# Altium footprint library SOT SOD TO DAPK.PcbLib: 156 footprints (part 1 of 10)
Each footprint in its own frame and in the unit in brackets; x right, y up, seen from the top. Pads: shape width x height; smd on the part's side, far side on the other; paste and mask are expansions set on the pad; w line width, h text height; cw(c..) or ccw(c..) is an arc to the next point about the centre after c.
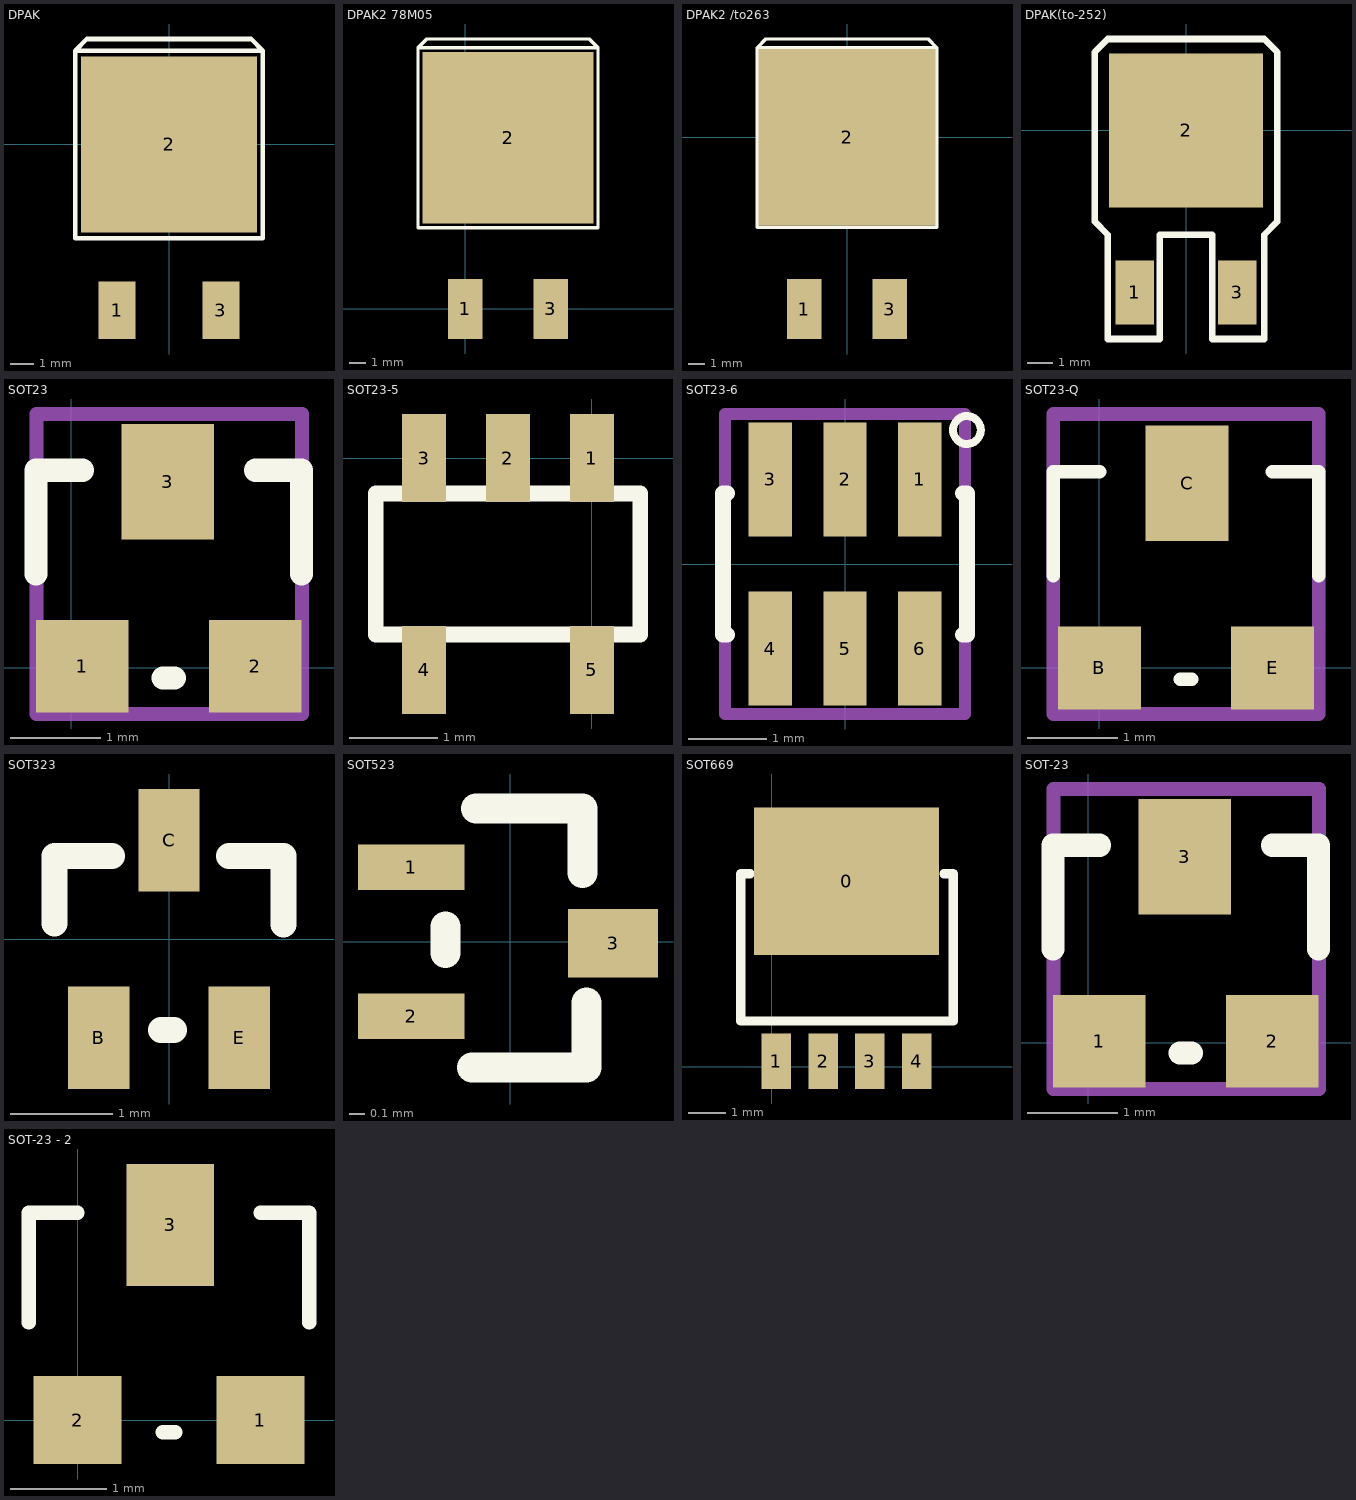
[diagram p0: the footprints below, top view; thin cyan lines are the x and y axes]

## DPAK [mm]
pads (3):
  rect 1.6x2.5 smd: 1(-2.25,-7.18) 3(2.25,-7.18)
  rect 7.62x7.62 smd: 2(0,0)
Top Overlay:
  lines w0.203: -4.064,4.064 4.064,4.064 ; -4.064,4.064 -4.064,-4.064 4.064,-4.064 4.064,4.064 ; -4.064,4.064 -3.556,4.572 3.556,4.572 4.064,4.064
3D body "User Library-DPAK_TO-252AA.step": height 2.37, standoff -0.03, extent -3.621,-7.241 3.113,2.859

## DPAK2 78M05 [mil]
pads (3):
  rect 80x140 smd: 1(0,0) 3(200,0)
  rect 400x400 smd: 2(100,400)
Top Overlay:
  lines w8: -110,610 310,610 ; -110,610 -110,190 310,190 310,610 ; -110,610 -90,630 290,630 310,610
3D body "SW3dPS-DPAK.STEP": height 192.32, standoff -5.24, extent -110,-30.72 290,570.22

## DPAK2 /to263 [mil]
pads (3):
  rect 80x140 smd: 1(-100,-401.57) 3(100,-401.57)
  rect 412.99x413.39 smd: 2(0,0)
Top Overlay:
  lines w8: -210,210 210,210 ; -210,210 -210,-210 210,-210 210,210 ; -210,210 -190,230 190,230 210,210
3D body "SW3dPS-DPAK.STEP": height 192.32, standoff -5.24, extent -205,-425 195,175.93

## DPAK(to-252) [mm]
pads (3):
  rect 1.5x2.5 smd: 1(-2,-6.312) 3(2,-6.312)
  rect 6x6 smd: 2(0,0)
Top Overlay:
  lines w0.254: -3.556,-3.556 -3.048,-4.064 -3.048,-8.128 -1.016,-8.128 -1.016,-4.064 1.016,-4.064 1.016,-8.128 3.048,-8.128 3.048,-4.064 3.556,-3.556 3.556,3.048 3.048,3.556 -3.048,3.556 -3.556,3.048 -3.556,-3.556

## PCBComponent_1 [mil]

## SOD-128 [mil]
3D body "User Library-SOD128.step": height 43.35, standoff -0.39, extent -173.43,-83.15 23.43,23.15

## SOD-882 [mil]
3D body "User Library-SOD882-1.step": height 18.9, standoff -1.18, extent -41.52,-19.39 -18.48,19.39

## SOT23 [mil]
pads (3):
  rect 40x40 smd: 1(4.88,0.63) 2(79.88,0.63)
  rect 40x50 smd: 3(41.88,80.63)
Top Overlay:
  lines w10: -15.12,40.63 -15.12,85.63 4.88,85.63 ; 39.88,-4.37 44.88,-4.37 ; 79.88,85.63 99.88,85.63 99.88,40.63
Mechanical 13:
  lines w6: -15,-20 -15,110 100,110 100,-20 -15,-20
  text ".Designator" at -5,35 h30
3D body "SOT-23-3.STEP": height 47.24, standoff 0, extent -14.87,-11.02 99.3,99.22

## SOT23-5 [mm]
pads (5):
  rect 0.5x1 smd: 1(0,0) 2(-0.95,0) 3(-1.9,0) 4(-1.9,-2.4) 5(0,-2.4)
Top Overlay:
  lines w0.178: -2.45,-2 0.55,-2 0.55,-0.4 -2.45,-0.4 -2.45,-2
3D body "User Library-SOT23-5.STEP": height 1.09, standoff -0.01, extent -2.399,-2.599 0.5,0.201

## SOT23-6 [mm] "SOT-23/SC-74A; 5 Leads; Body 3.1 x 3 mm, inc. leads (LxW max)"
height 1.45
pads (6):
  rect 0.55x1.45 smd: 1(0.95,1.075) 2(0,1.075) 3(-0.95,1.075) 4(-0.95,-1.075) 5(0,-1.075) 6(0.95,-1.075)
Top Overlay:
  circle w0.1: c1.549,1.702 r0.177
  lines w0.2: -1.5,-0.9 -1.55,-0.9 -1.55,0.9 -1.5,0.9 ; 1.5,-0.9 1.55,-0.9 1.55,0.9 1.5,0.9
Mechanical 13:
  lines w0.152: -1.524,-1.905 -1.524,1.905 1.524,1.905 1.524,-1.905 -1.524,-1.905
  text ".Designator" at -1.397,-0.127 h0.76
3D body "User Library-SOT-23-6.STEP": height 1.08, standoff -0.01, extent -1.397,-1.194 1.397,1.232

## SOT23-Q [mil]
pads (3):
  rect 35.98x35.98 smd: B(0,0) E(75,0)
  rect 36x50 smd: C(38,80)
Top Overlay:
  lines w5.91: -20,40 -20,85 0,85 ; 35,-5 40,-5 ; 75,85 95,85 95,40
Mechanical 13:
  lines w6: -20,-20 95,-20 95,110 -20,110 -20,-20
  text ".Designator" at -10,35 h30
3D body "SOT-23-3.STEP": height 47.24, standoff 0, extent -22.09,-10.12 92.09,100.12

## SOT323 [mm]
pads (3):
  rect 0.6x1 smd: B(-0.686,-0.965) C(0,0.965) E(0.686,-0.965)
Top Overlay:
  lines w0.254: -1.118,0.152 -1.118,0.813 -0.559,0.813 ; -0.076,-0.889 0.051,-0.889 ; 0.584,0.813 1.118,0.813 1.118,0.143
3D body "SOT323 (SC70-3)-1.STEP": height 1.1, standoff 0, extent -1.092,-1.097 1.108,1.148

## SOT523 [mil]
pads (3):
  rect 28x12 smd: 1(-25.98,19.58) 2(-25.98,-19.58)
  rect 23.62x18 smd: 3(26.98,-0.46)
Top Overlay:
  lines w7.87: -17,-3 -17,4 ; -10,-33 20,-33 20,-16 ; -9,35 19,35 19,18
3D body "SOT-523.step": height 31.5, standoff 0, extent -32.5,-31.49 30.49,31.5

## SOT669 [mil] "IFPAK"
pads (5):
  rect 196.85x157.48 smd: 0(80,198)
  rect 31.5x59.06 smd: 1(5,6) 2(55,6) 3(105,6) 4(155,6)
Top Overlay:
  lines w10: -23,206 -33,206 -33,49 194,49 194,206 184,206
3D body "User Library-SOT669-CW.step": height 61.02, standoff 13.78, extent -16.45,-0.08 176.46,252.99

## SOT-23 [mil]
pads (3):
  rect 40x40 smd: 1(4.88,0.63) 2(79.88,0.63)
  rect 40x50 smd: 3(41.88,80.63)
Top Overlay:
  lines w10: -15.12,40.63 -15.12,85.63 4.88,85.63 ; 39.88,-4.37 44.88,-4.37 ; 79.88,85.63 99.88,85.63 99.88,40.63
Mechanical 29:
  lines w6: -15,-20 -15,110 100,110 100,-20 -15,-20
  text ".Designator" at -5,35 h30
3D body "SOT-23-3.STEP": height 47.24, standoff 0, extent -14.87,-11.02 99.3,99.22

## SOT-23 - 2 [mil]
pads (3):
  rect 35.98x35.98 smd: 1(75,0) 2(0,0)
  rect 36x50 smd: 3(38,80)
Top Overlay:
  lines w5.91: -20,40 -20,85 0,85 ; 35,-5 40,-5 ; 75,85 95,85 95,40
3D body "SOT-23-3.STEP": height 47.24, standoff 0, extent -17.09,-10.12 97.09,100.12